# Altium footprint library SMD Passive.PcbLib: 136 footprints (part 6 of 9)
Each footprint in its own frame and in the unit in brackets; x right, y up, seen from the top. Pads: shape width x height; smd on the part's side, far side on the other; paste and mask are expansions set on the pad; w line width, h text height; cw(c..) or ccw(c..) is an arc to the next point about the centre after c.
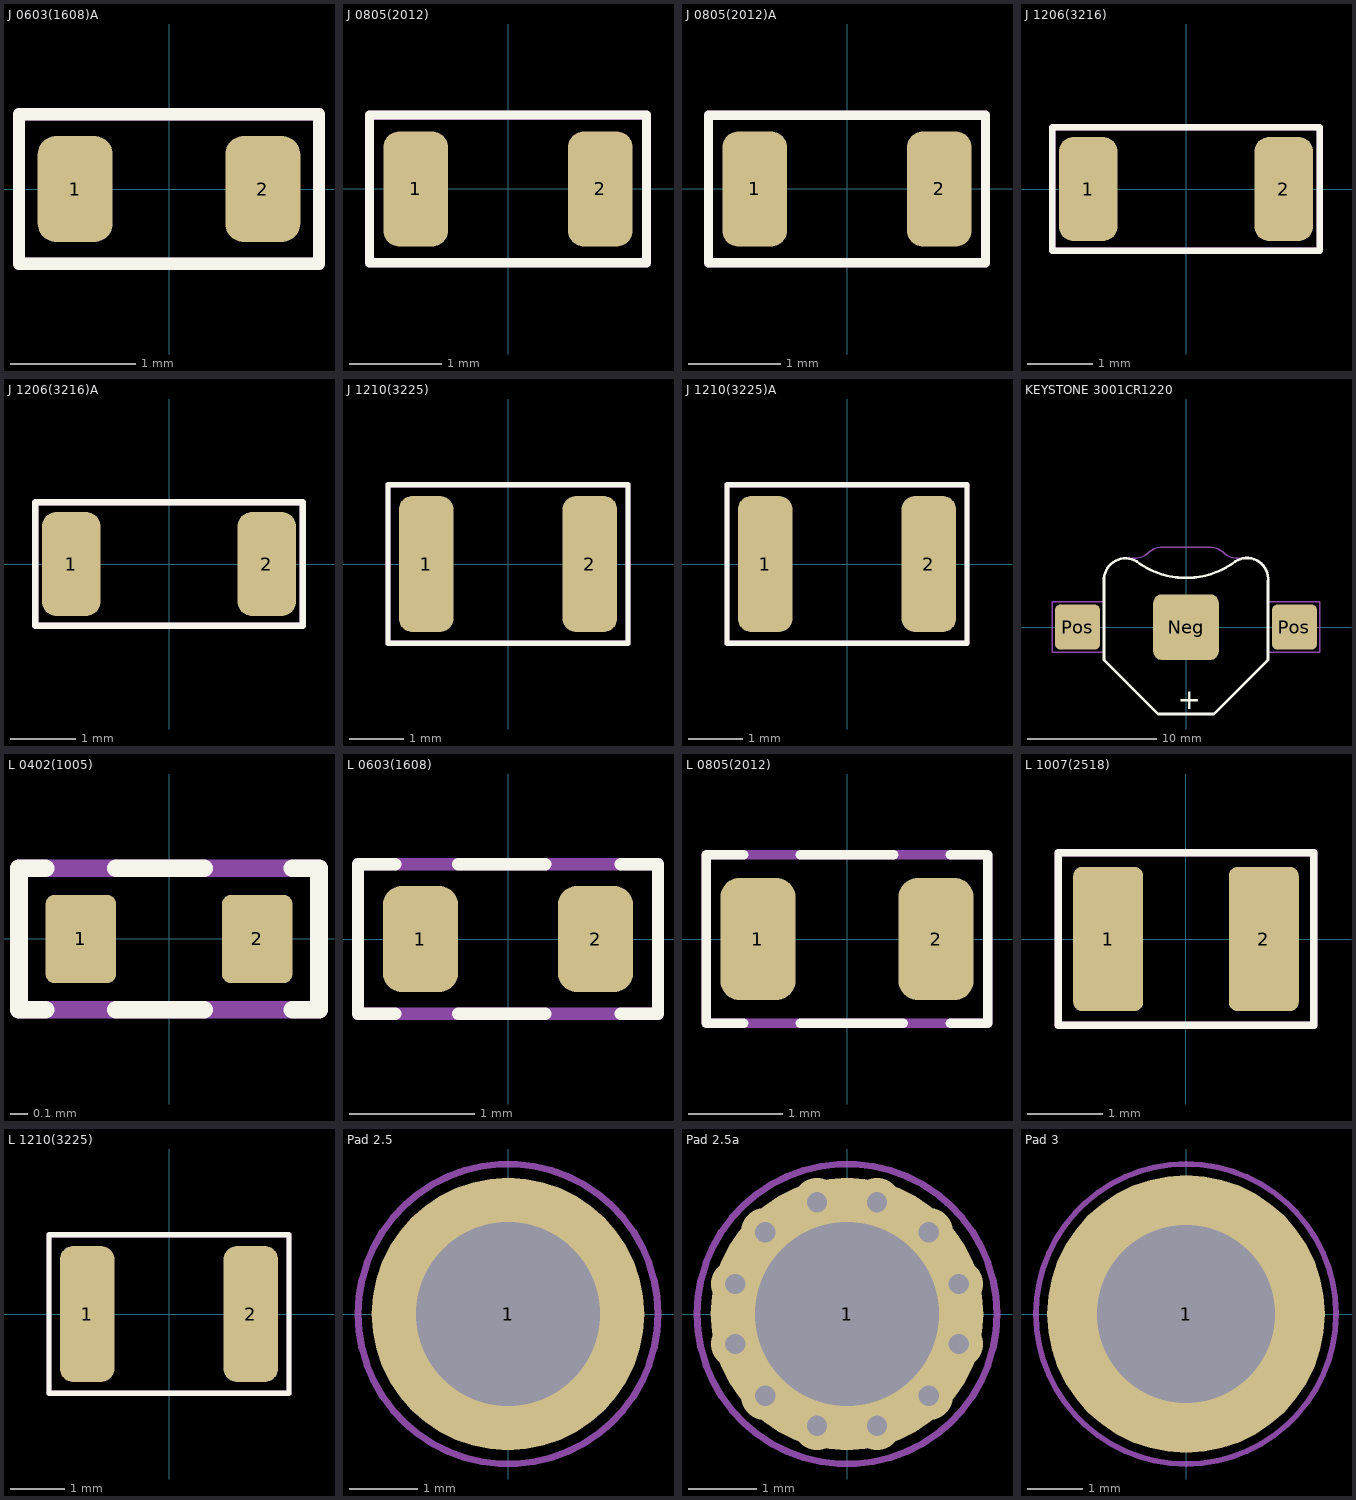
[diagram p5: the footprints below, top view; thin cyan lines are the x and y axes]

## J 0603(1608)A [mm]
height 0.45
pads (2):
  rrect50% 0.6x0.85 smd: 1(-0.75,0) 2(0.75,0)
Top Overlay:
  lines w0.1: -1.2,-0.6 1.2,-0.6 1.2,0.6 -1.2,0.6 -1.2,-0.6
Top Courtyard:
  lines w0.1: -1.2,-0.6 -1.2,0.6 1.2,0.6 1.2,-0.6 -1.2,-0.6
3D body "SMD R-0603-0.STEP": height 0.45, standoff 0, extent -0.8,-0.4 0.8,0.4

## J 0805(2012) [mm]
height 0.55
pads (2):
  rrect50% 0.7x1.25 smd: 1(-1,0) 2(1,0)
Top Overlay:
  lines w0.1: -1.5,-0.8 -1.5,0.8 1.5,0.8 1.5,-0.8 -1.5,-0.8
Top Courtyard:
  lines w0.1: -1.5,-0.8 -1.5,0.8 1.5,0.8 1.5,-0.8 -1.5,-0.8
3D body "SMD R-0805-0.STEP": height 0.6, standoff 0, extent -1,-0.625 1,0.625

## J 0805(2012)A [mm]
height 0.55
pads (2):
  rrect50% 0.7x1.25 smd: 1(-1,0) 2(1,0)
Top Overlay:
  lines w0.1: -1.5,-0.8 -1.5,0.8 1.5,0.8 1.5,-0.8 -1.5,-0.8
Top Courtyard:
  lines w0.1: -1.5,-0.8 1.5,-0.8 1.5,0.8 -1.5,0.8 -1.5,-0.8
3D body "SMD R-0805-0.STEP": height 0.6, standoff 0, extent -1,-0.625 1,0.625

## J 1206(3216) [mm]
height 0.55
pads (2):
  rrect50% 0.9x1.6 smd mask+0.102: 1(-1.5,0) 2(1.5,0)
Top Overlay:
  lines w0.1: -2.05,-0.95 2.05,-0.95 2.05,0.95 -2.05,0.95 -2.05,-0.95
Top Courtyard:
  lines w0.1: -2.05,-0.95 -2.05,0.95 2.05,0.95 2.05,-0.95 -2.05,-0.95
3D body "SMD R-1206-0.STEP": height 0.6, standoff 0, extent -1.6,-0.8 1.6,0.8

## J 1206(3216)A [mm]
height 0.55
pads (2):
  rrect50% 0.9x1.6 smd mask+0.102: 1(-1.5,0) 2(1.5,0)
Top Overlay:
  lines w0.1: -2.05,-0.95 -2.05,0.95 2.05,0.95 2.05,-0.95 -2.05,-0.95
Top Courtyard:
  lines w0.1: -2.05,-0.95 -2.05,0.95 2.05,0.95 2.05,-0.95 -2.05,-0.95
3D body "SMD R-1206-0.STEP": height 0.6, standoff 0, extent -1.6,-0.8 1.6,0.8

## J 1210(3225) [mm]
height 0.55
pads (2):
  rrect50% 1x2.5 smd: 1(-1.5,0) 2(1.5,0)
Top Overlay:
  lines w0.1: -2.2,-1.45 -2.2,1.45 2.2,1.45 2.2,-1.45 -2.2,-1.45
Top Courtyard:
  lines w0.1: -2.2,-1.45 2.2,-1.45 2.2,1.45 -2.2,1.45 -2.2,-1.45
3D body "SMD R-1210-0.STEP": height 0.6, standoff 0, extent -1.6,-1.25 1.6,1.25

## J 1210(3225)A [mm]
height 0.55
pads (2):
  rrect50% 1x2.5 smd: 1(-1.5,0) 2(1.5,0)
Top Overlay:
  lines w0.1: -2.2,-1.45 2.2,-1.45 2.2,1.45 -2.2,1.45 -2.2,-1.45
Top Courtyard:
  lines w0.1: -2.2,-1.45 2.2,-1.45 2.2,1.45 -2.2,1.45 -2.2,-1.45
3D body "SMD R-1210-0.STEP": height 0.6, standoff 0, extent -1.6,-1.25 1.6,1.25

## KEYSTONE 3001CR1220 [mm]
pads (3):
  rrect25% 5.08x5.08 smd: Neg(0,0)
  rrect25% 3.5x3.5 smd: Pos(-8.4,0) Pos(8.4,0)
Top Overlay:
  lines w0.2: -2.159,-6.731 2.159,-6.731
  lines w0.201: -6.35,3.55 -6.35,-2.54 -2.159,-6.731 ; -6.35,3.556 cw(c-4.688,3.664) -3.81,5.08 ccw(c0,10.16) 3.81,5.08 cw(c4.721,3.72) 6.35,3.556 ; 2.159,-6.731 6.35,-2.54 6.35,3.55
  text "+" at -0.65,-6.35 h1.59
Top Courtyard:
  lines w0.1: -3,5.698 cw(c-1.788,4.486) -1.788,6.2 1.8,6.2 ; -3,5.698 cw(c-3.84,6.538) -3.84,5.35 -4.65,5.35 ccw(c-4.65,3.65) -6.35,3.65 -6.35,1.95 -10.35,1.95 -10.35,-1.95 -6.35,-1.95 -6.35,-2.544 -2.163,-6.731 2.159,-6.731 6.35,-2.54 6.35,-1.95 10.35,-1.95 10.35,1.95 6.35,1.95 6.35,3.797 ccw(c4.797,3.797) 4.797,5.35 3.84,5.35 cw(c3.84,6.538) 3,5.698 ; 1.788,6.2 cw(c1.788,4.486) 3,5.698
3D body "CR1220-2.STEP": height 2, standoff 0, extent -6.2,-6.2 6.2,6.2
3D body "Keystone 3001.STEP": height 3.05, standoff -2.15, extent -7.45,-7 7.45,5.698

## L 0402(1005) [mm]
pads (2):
  rrect25% 0.4x0.5 smd mask+0.102: 1(-0.5,0) 2(0.5,0)
Top Overlay:
  lines w0.1: -0.7,-0.4 -0.85,-0.4 -0.85,0.4 -0.7,0.4 ; -0.3,-0.4 0.2,-0.4 ; -0.3,0.4 0.2,0.4 ; 0.7,-0.4 0.85,-0.4 0.85,0.4 0.7,0.4
Top Courtyard:
  lines w0.1: -0.85,-0.4 -0.85,0.4 0.85,0.4 0.85,-0.4 -0.85,-0.4
3D body "SMD L 0402 SLF.STEP": height 0.65, standoff -0.01, extent -0.595,-0.32 0.595,0.32

## L 0603(1608) [mm]
pads (2):
  rrect50% 0.6x0.85 smd: 1(-0.7,0) 2(0.7,0)
Top Overlay:
  lines w0.1: -0.9,-0.6 -1.2,-0.6 -1.2,0.6 -0.9,0.6 ; -0.4,-0.6 0.3,-0.6 ; -0.4,0.6 0.3,0.6 ; 0.9,-0.6 1.2,-0.6 1.2,0.6 0.9,0.6
Top Courtyard:
  lines w0.1: -1.2,-0.6 1.2,-0.6 1.2,0.6 -1.2,0.6 -1.2,-0.6
3D body "SMD L 0603 SLF.STEP": height 1, standoff -0.02, extent -0.9,-0.56 0.9,0.56

## L 0805(2012) [mm]
pads (2):
  rrect50% 0.8x1.3 smd: 1(-0.95,0) 2(0.95,0)
Top Overlay:
  lines w0.1: -1.1,-0.9 -1.5,-0.9 -1.5,0.9 -1.1,0.9 ; -0.5,-0.9 0.6,-0.9 ; -0.5,0.9 0.5,0.9 ; 1.1,-0.9 1.5,-0.9 1.5,0.9 1.1,0.9
Top Courtyard:
  lines w0.1: -1.5,-0.9 -1.5,0.9 1.5,0.9 1.5,-0.9 -1.5,-0.9
3D body "SMD L 0805 SLF.STEP": height 1.45, standoff 0, extent -1.05,-0.9 1.05,0.9

## L 1007(2518) [mm] "Chip Inductor, 2-Leads, Body 2.50x1.80mm, IPC High Density"
height 2
pads (2):
  rrect25% 0.93x1.92 smd: 1(-1.035,0) 2(1.035,0)
Top Overlay:
  lines w0.1: -1.7,-1.15 1.7,-1.15 1.7,1.15 -1.7,1.15 -1.7,-1.15
Top Courtyard:
  lines w0.1: -1.7,-1.15 1.7,-1.15 1.7,1.15 -1.7,1.15 -1.7,-1.15
3D body "INDC2518X20L.step": height 2, standoff 0, extent -1.35,-1 1.35,1

## L 1210(3225) [mm]
pads (2):
  rrect50% 1x2.5 smd: 1(-1.5,0) 2(1.5,0)
Top Overlay:
  lines w0.1: -2.2,-1.45 2.2,-1.45 2.2,1.45 -2.2,1.45 -2.2,-1.45
Top Courtyard:
  lines w0.1: -2.2,-1.45 2.2,-1.45 2.2,1.45 -2.2,1.45 -2.2,-1.45
3D body "PI LQH32CN (1210).STEP": height 2, standoff 0, extent -1.601,-1.355 1.601,1.355

## Pad 2.5 [mm]
pads (1):
  round 4 hole 2.7 paste-2539.97: 1(0,0)
Top Courtyard:
  circle w0.1: c0,0 r2.201

## Pad 2.5a [mm]
pads (1):
  round 4 hole 2.7 paste-2539.97: 1(0,0)
via -1.642,0.44 diameter 0.7 hole 0.3
via -1.202,1.202 diameter 0.7 hole 0.3
via -0.44,1.642 diameter 0.7 hole 0.3
via 0.44,1.642 diameter 0.7 hole 0.3
via 1.202,1.202 diameter 0.7 hole 0.3
via 1.642,0.44 diameter 0.7 hole 0.3
via 1.642,-0.44 diameter 0.7 hole 0.3
via 1.202,-1.202 diameter 0.7 hole 0.3
via 0.44,-1.642 diameter 0.7 hole 0.3
via -0.44,-1.642 diameter 0.7 hole 0.3
via -1.202,-1.202 diameter 0.7 hole 0.3
via -1.642,-0.44 diameter 0.7 hole 0.3
Top Courtyard:
  circle w0.1: c0,0 r2.2

## Pad 3 [mm]
pads (1):
  round 5 hole 3.2 paste-2539.97: 1(0,0)
Top Courtyard:
  circle w0.1: c0,0 r2.7